# Altium footprint library 3M THD.PcbLib: 163 footprints (part 2 of 14) (continued)
## 3M_5150-B7A2PL [mm] "50 Contacts - Right Angle .100\" x .100\" Polarized Boardmount Socket, 5100 Series"
height 8.59
pads (52):
  round 1.6 hole 0.9: 1(30.48,-1.27) 2(30.48,1.27) 3(27.94,-1.27) 4(27.94,1.27) 5(25.4,-1.27) 6(25.4,1.27) 7(22.86,-1.27) 8(22.86,1.27) 9(20.32,-1.27) 10(20.32,1.27) 11(17.78,-1.27) 12(17.78,1.27) 13(15.24,-1.27) 14(15.24,1.27) 15(12.7,-1.27) 16(12.7,1.27) 17(10.16,-1.27) 18(10.16,1.27) 19(7.62,-1.27) 20(7.62,1.27) 21(5.08,-1.27) 22(5.08,1.27) 23(2.54,-1.27) 24(2.54,1.27) 25(0,-1.27) 26(0,1.27) 27(-2.54,-1.27) 28(-2.54,1.27) 29(-5.08,-1.27) 30(-5.08,1.27) 31(-7.62,-1.27) 32(-7.62,1.27) 33(-10.16,-1.27) 34(-10.16,1.27) 35(-12.7,-1.27) 36(-12.7,1.27) 37(-15.24,-1.27) 38(-15.24,1.27) 39(-17.78,-1.27) 40(-17.78,1.27) 41(-20.32,-1.27) 42(-20.32,1.27) 43(-22.86,-1.27) 44(-22.86,1.27) 45(-25.4,-1.27) 46(-25.4,1.27) 47(-27.94,-1.27) 48(-27.94,1.27) 49(-30.48,-1.27) 50(-30.48,1.27)
  round 5.5 hole 2.6: 51(-35.55,1.27) 52(35.55,1.27)
Top Overlay:
  circle w0.3: c30.48,-2.756 r0.15
  lines w0.2: -38.1,-0.579 -38.1,-1.888 -31.509,-1.888 ; -38.1,3.119 -38.1,4.97 -1.651,4.97 ; -38.1,4.462 -34.29,4.462 cw(c-34.29,3.192) -33.02,3.192 -33.02,3.147 ; -34.036,4.97 -34.036,12.59 34.036,12.59 34.036,4.97 ; -33.02,-1.888 -33.02,-0.607 ; -32.533,2.176 -31.267,2.176 ; -1.651,2.176 -1.651,12.59 ; 1.651,2.176 1.651,12.59 ; 1.651,4.97 38.1,4.97 38.1,3.119 ; 31.267,2.176 32.533,2.176 ; 31.509,-1.888 38.1,-1.888 38.1,-0.579 ; 33.02,-1.888 33.02,-0.607 ; 33.02,3.147 33.02,3.192 cw(c34.29,3.192) 34.29,4.462 38.1,4.462
  text "1" at 31.985,-1.312 h1.2
Mechanical 8:
  drawing of 213 lines, arcs and shapes, not listed
Mechanical 14:
  circle w0.1: c-35.55,1.27 r1.27
  circle w0.1: c35.55,1.27 r1.27
  circle w0.3: c30.48,-2.756 r0.15
  lines w0.1: -38.1,4.462 -34.29,4.462 cw(c-34.29,3.192) -33.02,3.192 -33.02,-1.888 ; -34.036,4.97 -34.036,12.59 34.036,12.59 34.036,4.97 ; -33.02,2.176 -1.651,2.176 -1.651,12.59 ; -1.651,4.97 -38.1,4.97 -38.1,-1.888 38.1,-1.888 38.1,4.97 1.651,4.97 ; 1.651,12.59 1.651,2.176 33.02,2.176 ; 33.02,-1.888 33.02,3.192 cw(c34.29,3.192) 34.29,4.462 38.1,4.462
  text "1" at 31.985,-1.312 h1.2
3D body "3M_5150-B7A2PL.stp": height 8.38, standoff -2.6, extent -38.1,-1.888 38.1,12.59

## 3M_6850-4500PL [mm] "50 Contacts - Straight .100\" x .100\" Centerbump Polarization Boardmount Socket, 6800 Series"
height 7.2
pads (50):
  round 1.6 hole 0.9: 1(30.48,1.27) 2(30.48,-1.27) 3(27.94,1.27) 4(27.94,-1.27) 5(25.4,1.27) 6(25.4,-1.27) 7(22.86,1.27) 8(22.86,-1.27) 9(20.32,1.27) 10(20.32,-1.27) 11(17.78,1.27) 12(17.78,-1.27) 13(15.24,1.27) 14(15.24,-1.27) 15(12.7,1.27) 16(12.7,-1.27) 17(10.16,1.27) 18(10.16,-1.27) 19(7.62,1.27) 20(7.62,-1.27) 21(5.08,1.27) 22(5.08,-1.27) 23(2.54,1.27) 24(2.54,-1.27) 25(0,1.27) 26(0,-1.27) 27(-2.54,1.27) 28(-2.54,-1.27) 29(-5.08,1.27) 30(-5.08,-1.27) 31(-7.62,1.27) 32(-7.62,-1.27) 33(-10.16,1.27) 34(-10.16,-1.27) 35(-12.7,1.27) 36(-12.7,-1.27) 37(-15.24,1.27) 38(-15.24,-1.27) 39(-17.78,1.27) 40(-17.78,-1.27) 41(-20.32,1.27) 42(-20.32,-1.27) 43(-22.86,1.27) 44(-22.86,-1.27) 45(-25.4,1.27) 46(-25.4,-1.27) 47(-27.94,1.27) 48(-27.94,-1.27) 49(-30.48,1.27) 50(-30.48,-1.27)
Top Overlay:
  circle w0.3: c30.48,-3.556 r0.15
  lines w0.2: -1.7,-3.05 -1.7,-4.05 1.7,-4.05 1.7,-3.05 ; -34.08,-2.3 ccw(c-33.33,-2.3) -33.33,-3.05 33.33,-3.05 ccw(c33.33,-2.3) 34.08,-2.3 34.08,-1.6 33.08,-1.6 33.08,1.6 34.08,1.6 34.08,2.3 ccw(c33.33,2.3) 33.33,3.05 -33.33,3.05 ccw(c-33.33,2.3) -34.08,2.3 -34.08,1.6 -33.08,1.6 -33.08,-1.6 -34.08,-1.6 -34.08,-2.3
Mechanical 8:
  drawing of 204 lines, arcs and shapes, not listed
Mechanical 14:
  drawing of 622 lines, arcs and shapes, not listed
3D body "3M_6850-4500PL.stp": height 7.2, standoff -2.8, extent -34.08,-4.05 34.08,3.05

## 3M_8510-4500PL [mm] "10 Contacts - Straight .100\" x .100\" Polarized Boardmount Socket, 8500 Series"
height 10.8
pads (10):
  round 1.7 hole 1: 1(5.08,-1.27) 2(5.08,1.27) 3(2.54,-1.27) 4(2.54,1.27) 5(0,-1.27) 6(0,1.27) 7(-2.54,-1.27) 8(-2.54,1.27) 9(-5.08,-1.27) 10(-5.08,1.27)
Top Overlay:
  circle w0.3: c5.08,-3.556 r0.15
  lines w0.2: -8.61,-1.625 ccw(c-7.21,-1.625) -7.21,-3.025 -1.7,-3.025 -1.7,-4.025 1.7,-4.025 1.7,-3.025 7.21,-3.025 ccw(c7.21,-1.625) 8.61,-1.625 8.61,-1.2 7.61,-1.2 7.61,1.2 8.61,1.2 8.61,1.625 ccw(c7.21,1.625) 7.21,3.025 -7.21,3.025 ccw(c-7.21,1.625) -8.61,1.625 -8.61,1.2 -7.61,1.2 -7.61,-1.2 -8.61,-1.2 -8.61,-1.625
Mechanical 8:
  lines w0.1: -5.58,-1.27 -5.08,-1.27 ; -5.58,1.27 -5.08,1.27 ; -5.08,-1.77 -5.08,-1.27 ; -5.08,-0.77 -5.08,-1.27 ; -5.08,0.77 -5.08,1.27 ; -5.08,1.77 -5.08,1.27 ; -4.58,-1.27 -5.08,-1.27 ; -4.58,1.27 -5.08,1.27 ; -3.04,-1.27 -2.54,-1.27 ; -3.04,1.27 -2.54,1.27 ; -2.54,-1.77 -2.54,-1.27 ; -2.54,-0.77 -2.54,-1.27 ; -2.54,0.77 -2.54,1.27 ; -2.54,1.77 -2.54,1.27 ; -2.04,-1.27 -2.54,-1.27 ; -2.04,1.27 -2.54,1.27 ; -0.5,-1.27 0,-1.27 ; -0.5,0 0,0 ; -0.5,1.27 0,1.27 ; 0,-1.77 0,-1.27 ; 0,-0.77 0,-1.27 ; 0,-0.5 0,0 ; 0,0.5 0,0 ; 0,0.77 0,1.27 ; 0,1.77 0,1.27 ; 0.5,-1.27 0,-1.27 ; 0.5,0 0,0 ; 0.5,1.27 0,1.27 ; 2.04,-1.27 2.54,-1.27 ; 2.04,1.27 2.54,1.27 ; 2.54,-1.77 2.54,-1.27 ; 2.54,-0.77 2.54,-1.27 ; 2.54,0.77 2.54,1.27 ; 2.54,1.77 2.54,1.27 ; 3.04,-1.27 2.54,-1.27 ; 3.04,1.27 2.54,1.27 ; 4.58,-1.27 5.08,-1.27 ; 4.58,1.27 5.08,1.27 ; 5.08,-1.77 5.08,-1.27 ; 5.08,-0.77 5.08,-1.27 ; 5.08,0.77 5.08,1.27 ; 5.08,1.77 5.08,1.27 ; 5.58,-1.27 5.08,-1.27 ; 5.58,1.27 5.08,1.27
Mechanical 14:
  circle w0.3: c5.08,-3.556 r0.15
  lines w0.1: 4.216,-3.05 5.08,-2.186 5.944,-3.05 ; -6.05,-2.27 -5.45,-1.67 ; -6.05,-2.27 -6.05,-0.27 ; -6.05,-2.27 -4.11,-2.27 ; -6.05,-0.27 -5.45,-0.87 ; -6.05,-0.27 -4.11,-0.27 ; -6.05,0.27 -5.45,0.87 ; -6.05,0.27 -4.11,0.27 ; -6.05,0.27 -6.05,2.27 ; -6.05,2.27 -5.45,1.67 ; -6.05,2.27 -4.11,2.27 ; -5.45,-1.67 -5.45,-0.87 ; -5.45,-1.67 -4.71,-1.67 ; -5.45,-0.87 -4.71,-0.87 ; -5.45,0.87 -5.45,1.67 ; -5.45,0.87 -4.71,0.87 ; -5.45,1.67 -4.71,1.67 ; -4.71,-1.67 -4.11,-2.27 ; -4.71,-1.67 -4.71,-0.87 ; -4.71,-0.87 -4.11,-0.27 ; -4.71,0.87 -4.11,0.27 ; -4.71,0.87 -4.71,1.67 ; -4.71,1.67 -4.11,2.27 ; -4.11,-2.27 -4.11,-0.27 ; -4.11,0.27 -4.11,2.27 ; -3.51,-2.27 -2.91,-1.67 ; -3.51,-2.27 -3.51,-0.27 ; -3.51,-2.27 -1.57,-2.27 ; -3.51,-0.27 -2.91,-0.87 ; -3.51,-0.27 -1.57,-0.27 ; -3.51,0.27 -2.91,0.87 ; -3.51,0.27 -1.57,0.27 ; -3.51,0.27 -3.51,2.27 ; -3.51,2.27 -2.91,1.67 ; -3.51,2.27 -1.57,2.27 ; -2.91,-1.67 -2.91,-0.87 ; -2.91,-1.67 -2.17,-1.67 ; -2.91,-0.87 -2.17,-0.87 ; -2.91,0.87 -2.91,1.67 ; -2.91,0.87 -2.17,0.87 ; -2.91,1.67 -2.17,1.67 ; -2.17,-1.67 -1.57,-2.27 ; -2.17,-1.67 -2.17,-0.87 ; -2.17,-0.87 -1.57,-0.27 ; -2.17,0.87 -1.57,0.27 ; -2.17,0.87 -2.17,1.67 ; -2.17,1.67 -1.57,2.27 ; -1.57,-2.27 -1.57,-0.27 ; -1.57,0.27 -1.57,2.27 ; -0.97,-2.27 -0.37,-1.67 ; -0.97,-2.27 -0.97,-0.27 ; -0.97,-2.27 0.97,-2.27 ; -0.97,-0.27 -0.37,-0.87 ; -0.97,-0.27 0.97,-0.27 ; -0.97,0.27 -0.37,0.87 ; -0.97,0.27 0.97,0.27 ; -0.97,0.27 -0.97,2.27 ; -0.97,2.27 -0.37,1.67 ; -0.97,2.27 0.97,2.27 ; -0.37,-1.67 -0.37,-0.87 ; -0.37,-1.67 0.37,-1.67 ; -0.37,-0.87 0.37,-0.87 ; -0.37,0.87 -0.37,1.67 ; -0.37,0.87 0.37,0.87 ; -0.37,1.67 0.37,1.67 ; 0.37,-1.67 0.97,-2.27 ; 0.37,-1.67 0.37,-0.87 ; 0.37,-0.87 0.97,-0.27 ; 0.37,0.87 0.97,0.27 ; 0.37,0.87 0.37,1.67 ; 0.37,1.67 0.97,2.27 ; 0.97,-2.27 0.97,-0.27 ; 0.97,0.27 0.97,2.27 ; 1.57,-2.27 2.17,-1.67 ; 1.57,-2.27 1.57,-0.27 ; 1.57,-2.27 3.51,-2.27 ; 1.57,-0.27 2.17,-0.87 ; 1.57,-0.27 3.51,-0.27 ; 1.57,0.27 2.17,0.87 ; 1.57,0.27 3.51,0.27 ; 1.57,0.27 1.57,2.27 ; 1.57,2.27 2.17,1.67 ; 1.57,2.27 3.51,2.27 ; 2.17,-1.67 2.17,-0.87 ; 2.17,-1.67 2.91,-1.67 ; 2.17,-0.87 2.91,-0.87 ; 2.17,0.87 2.17,1.67 ; 2.17,0.87 2.91,0.87 ; 2.17,1.67 2.91,1.67 ; 2.91,-1.67 3.51,-2.27 ; 2.91,-1.67 2.91,-0.87 ; 2.91,-0.87 3.51,-0.27 ; 2.91,0.87 3.51,0.27 ; 2.91,0.87 2.91,1.67 ; 2.91,1.67 3.51,2.27 ; 3.51,-2.27 3.51,-0.27 ; 3.51,0.27 3.51,2.27 ; 4.11,-2.27 4.71,-1.67 ; 4.11,-2.27 4.11,-0.27 ; 4.11,-2.27 6.05,-2.27 ; 4.11,-0.27 4.71,-0.87 ; 4.11,-0.27 6.05,-0.27 ; 4.11,0.27 4.71,0.87 ; 4.11,0.27 6.05,0.27 ; 4.11,0.27 4.11,2.27 ; 4.11,2.27 4.71,1.67 ; 4.11,2.27 6.05,2.27 ; 4.71,-1.67 4.71,-0.87 ; 4.71,-1.67 5.45,-1.67 ; 4.71,-0.87 5.45,-0.87 ; 4.71,0.87 4.71,1.67 ; 4.71,0.87 5.45,0.87 ; 4.71,1.67 5.45,1.67 ; 5.45,-1.67 6.05,-2.27 ; 5.45,-1.67 5.45,-0.87 ; 5.45,-0.87 6.05,-0.27 ; 5.45,0.87 6.05,0.27 ; 5.45,0.87 5.45,1.67 ; 5.45,1.67 6.05,2.27 ; 6.05,-2.27 6.05,-0.27 ; 6.05,0.27 6.05,2.27 ; -8.61,-1.625 ccw(c-7.21,-1.625) -7.21,-3.025 -1.7,-3.025 -1.7,-4.025 1.7,-4.025 1.7,-3.025 7.21,-3.025 ccw(c7.21,-1.625) 8.61,-1.625 8.61,-1.2 7.61,-1.2 7.61,1.2 8.61,1.2 8.61,1.625 ccw(c7.21,1.625) 7.21,3.025 -7.21,3.025 ccw(c-7.21,1.625) -8.61,1.625 -8.61,1.2 -7.61,1.2 -7.61,-1.2 -8.61,-1.2 -8.61,-1.625
3D body "3M_8510-4500PL.stp": height 10.8, standoff -2.8, extent -8.61,-4.025 8.61,3.025

## 3M_8516-4500PL [mm] "16 Contacts - Straight .100\" x .100\" Polarized Boardmount Socket, 8500 Series"
height 10.8
pads (16):
  round 1.7 hole 1: 1(8.89,-1.27) 2(8.89,1.27) 3(6.35,-1.27) 4(6.35,1.27) 5(3.81,-1.27) 6(3.81,1.27) 7(1.27,-1.27) 8(1.27,1.27) 9(-1.27,-1.27) 10(-1.27,1.27) 11(-3.81,-1.27) 12(-3.81,1.27) 13(-6.35,-1.27) 14(-6.35,1.27) 15(-8.89,-1.27) 16(-8.89,1.27)
Top Overlay:
  circle w0.3: c11.43,-3.556 r0.15
  lines w0.2: 12.406,1.729 12.41,1.2 11.41,1.2 11.41,-1.2 12.41,-1.2 12.41,-1.625 cw(c11.01,-1.625) 11.01,-3.025 5.83,-3.025 5.449,-2.365 4.691,-2.365 4.31,-3.025 1.7,-3.025 1.7,-4.025 -1.7,-4.025 -1.7,-3.025 -6.85,-3.025 -7.231,-2.365 -7.989,-2.365 -8.37,-3.025 -11.01,-3.025 cw(c-11.01,-1.625) -12.41,-1.625 -12.41,-1.2 -11.41,-1.2 -11.41,1.2 -12.41,1.2 -12.41,1.625 cw(c-11.01,1.625) -11.01,3.025 11.01,3.025 cw(c11.01,1.625) 12.41,1.625
Mechanical 8:
  lines w0.05: -9.39,-1.27 -8.89,-1.27 ; -9.39,1.27 -8.89,1.27 ; -8.89,-1.77 -8.89,-1.27 ; -8.89,-0.77 -8.89,-1.27 ; -8.89,0.77 -8.89,1.27 ; -8.89,1.77 -8.89,1.27 ; -8.39,-1.27 -8.89,-1.27 ; -8.39,1.27 -8.89,1.27 ; -6.85,-1.27 -6.35,-1.27 ; -6.85,1.27 -6.35,1.27 ; -6.35,-1.77 -6.35,-1.27 ; -6.35,-0.77 -6.35,-1.27 ; -6.35,0.77 -6.35,1.27 ; -6.35,1.77 -6.35,1.27 ; -5.85,-1.27 -6.35,-1.27 ; -5.85,1.27 -6.35,1.27 ; -4.31,-1.27 -3.81,-1.27 ; -4.31,1.27 -3.81,1.27 ; -3.81,-1.77 -3.81,-1.27 ; -3.81,-0.77 -3.81,-1.27 ; -3.81,0.77 -3.81,1.27 ; -3.81,1.77 -3.81,1.27 ; -3.31,-1.27 -3.81,-1.27 ; -3.31,1.27 -3.81,1.27 ; -1.77,-1.27 -1.27,-1.27 ; -1.77,1.27 -1.27,1.27 ; -1.27,-1.77 -1.27,-1.27 ; -1.27,-0.77 -1.27,-1.27 ; -1.27,0.77 -1.27,1.27 ; -1.27,1.77 -1.27,1.27 ; -0.77,-1.27 -1.27,-1.27 ; -0.77,1.27 -1.27,1.27 ; -0.5,0 0,0 ; 0,-0.5 0,0 ; 0,0.5 0,0 ; 0.5,0 0,0 ; 0.77,-1.27 1.27,-1.27 ; 0.77,1.27 1.27,1.27 ; 1.27,-1.77 1.27,-1.27 ; 1.27,-0.77 1.27,-1.27 ; 1.27,0.77 1.27,1.27 ; 1.27,1.77 1.27,1.27 ; 1.77,-1.27 1.27,-1.27 ; 1.77,1.27 1.27,1.27 ; 3.31,-1.27 3.81,-1.27 ; 3.31,1.27 3.81,1.27 ; 3.81,-1.77 3.81,-1.27 ; 3.81,-0.77 3.81,-1.27 ; 3.81,0.77 3.81,1.27 ; 3.81,1.77 3.81,1.27 ; 4.31,-1.27 3.81,-1.27 ; 4.31,1.27 3.81,1.27 ; 5.85,-1.27 6.35,-1.27 ; 5.85,1.27 6.35,1.27 ; 6.35,-1.77 6.35,-1.27 ; 6.35,-0.77 6.35,-1.27 ; 6.35,0.77 6.35,1.27 ; 6.35,1.77 6.35,1.27 ; 6.85,-1.27 6.35,-1.27 ; 6.85,1.27 6.35,1.27 ; 8.39,-1.27 8.89,-1.27 ; 8.39,1.27 8.89,1.27 ; 8.89,-1.77 8.89,-1.27 ; 8.89,-0.77 8.89,-1.27 ; 8.89,0.77 8.89,1.27 ; 8.89,1.77 8.89,1.27 ; 9.39,-1.27 8.89,-1.27 ; 9.39,1.27 8.89,1.27
Mechanical 14:
  drawing of 228 lines, arcs and shapes, not listed
3D body "3M_8516-4500PL.stp": height 10.8, standoff -2.8, extent -12.41,-4.025 12.41,3.025

## 3M_8520-4500PL [mm] "20 Contacts - Straight .100\" x .100\" Polarized Boardmount Socket, 8500 Series"
height 10.8
pads (20):
  round 1.7 hole 1: 1(11.43,-1.27) 2(11.43,1.27) 3(8.89,-1.27) 4(8.89,1.27) 5(6.35,-1.27) 6(6.35,1.27) 7(3.81,-1.27) 8(3.81,1.27) 9(1.27,-1.27) 10(1.27,1.27) 11(-1.27,-1.27) 12(-1.27,1.27) 13(-3.81,-1.27) 14(-3.81,1.27) 15(-6.35,-1.27) 16(-6.35,1.27) 17(-8.89,-1.27) 18(-8.89,1.27) 19(-11.43,-1.27) 20(-11.43,1.27)
Top Overlay:
  circle w0.3: c11.43,-3.556 r0.15
  lines w0.2: 14.946,1.729 14.95,1.2 13.95,1.2 13.95,-1.2 14.95,-1.2 14.95,-1.625 cw(c13.55,-1.625) 13.55,-3.025 8.37,-3.025 7.989,-2.365 7.231,-2.365 6.85,-3.025 1.7,-3.025 1.7,-4.025 -1.7,-4.025 -1.7,-3.025 -9.39,-3.025 -9.771,-2.365 -10.529,-2.365 -10.91,-3.025 -13.55,-3.025 cw(c-13.55,-1.625) -14.95,-1.625 -14.95,-1.2 -13.95,-1.2 -13.95,1.2 -14.95,1.2 -14.95,1.625 cw(c-13.55,1.625) -13.55,3.025 13.55,3.025 cw(c13.55,1.625) 14.95,1.625
Mechanical 8:
  lines w0.1: -11.93,-1.27 -11.43,-1.27 ; -11.93,1.27 -11.43,1.27 ; -11.43,-1.77 -11.43,-1.27 ; -11.43,-0.77 -11.43,-1.27 ; -11.43,0.77 -11.43,1.27 ; -11.43,1.77 -11.43,1.27 ; -10.93,-1.27 -11.43,-1.27 ; -10.93,1.27 -11.43,1.27 ; -9.39,-1.27 -8.89,-1.27 ; -9.39,1.27 -8.89,1.27 ; -8.89,-1.77 -8.89,-1.27 ; -8.89,-0.77 -8.89,-1.27 ; -8.89,0.77 -8.89,1.27 ; -8.89,1.77 -8.89,1.27 ; -8.39,-1.27 -8.89,-1.27 ; -8.39,1.27 -8.89,1.27 ; -6.85,-1.27 -6.35,-1.27 ; -6.85,1.27 -6.35,1.27 ; -6.35,-1.77 -6.35,-1.27 ; -6.35,-0.77 -6.35,-1.27 ; -6.35,0.77 -6.35,1.27 ; -6.35,1.77 -6.35,1.27 ; -5.85,-1.27 -6.35,-1.27 ; -5.85,1.27 -6.35,1.27 ; -4.31,-1.27 -3.81,-1.27 ; -4.31,1.27 -3.81,1.27 ; -3.81,-1.77 -3.81,-1.27 ; -3.81,-0.77 -3.81,-1.27 ; -3.81,0.77 -3.81,1.27 ; -3.81,1.77 -3.81,1.27 ; -3.31,-1.27 -3.81,-1.27 ; -3.31,1.27 -3.81,1.27 ; -1.77,-1.27 -1.27,-1.27 ; -1.77,1.27 -1.27,1.27 ; -1.27,-1.77 -1.27,-1.27 ; -1.27,-0.77 -1.27,-1.27 ; -1.27,0.77 -1.27,1.27 ; -1.27,1.77 -1.27,1.27 ; -0.77,-1.27 -1.27,-1.27 ; -0.77,1.27 -1.27,1.27 ; -0.5,0 0,0 ; 0,-0.5 0,0 ; 0,0.5 0,0 ; 0.5,0 0,0 ; 0.77,-1.27 1.27,-1.27 ; 0.77,1.27 1.27,1.27 ; 1.27,-1.77 1.27,-1.27 ; 1.27,-0.77 1.27,-1.27 ; 1.27,0.77 1.27,1.27 ; 1.27,1.77 1.27,1.27 ; 1.77,-1.27 1.27,-1.27 ; 1.77,1.27 1.27,1.27 ; 3.31,-1.27 3.81,-1.27 ; 3.31,1.27 3.81,1.27 ; 3.81,-1.77 3.81,-1.27 ; 3.81,-0.77 3.81,-1.27 ; 3.81,0.77 3.81,1.27 ; 3.81,1.77 3.81,1.27 ; 4.31,-1.27 3.81,-1.27 ; 4.31,1.27 3.81,1.27 ; 5.85,-1.27 6.35,-1.27 ; 5.85,1.27 6.35,1.27 ; 6.35,-1.77 6.35,-1.27 ; 6.35,-0.77 6.35,-1.27 ; 6.35,0.77 6.35,1.27 ; 6.35,1.77 6.35,1.27 ; 6.85,-1.27 6.35,-1.27 ; 6.85,1.27 6.35,1.27 ; 8.39,-1.27 8.89,-1.27 ; 8.39,1.27 8.89,1.27 ; 8.89,-1.77 8.89,-1.27 ; 8.89,-0.77 8.89,-1.27 ; 8.89,0.77 8.89,1.27 ; 8.89,1.77 8.89,1.27 ; 9.39,-1.27 8.89,-1.27 ; 9.39,1.27 8.89,1.27 ; 10.93,-1.27 11.43,-1.27 ; 10.93,1.27 11.43,1.27 ; 11.43,-1.77 11.43,-1.27 ; 11.43,-0.77 11.43,-1.27 ; 11.43,0.77 11.43,1.27 ; 11.43,1.77 11.43,1.27 ; 11.93,-1.27 11.43,-1.27 ; 11.93,1.27 11.43,1.27
Mechanical 14:
  drawing of 280 lines, arcs and shapes, not listed
3D body "3M_8520-4500PL.stp": height 10.8, standoff -2.8, extent -14.95,-4.025 14.95,3.025

## 3M_9120-4500PL [mm] "20 Contacts - Straight .100\" x .100\" Polarized Boardmount Socket, 9100 Series"
height 9
pads (20):
  round 1.6 hole 0.9: 1(11.43,-1.27) 2(11.43,1.27) 3(8.89,-1.27) 4(8.89,1.27) 5(6.35,-1.27) 6(6.35,1.27) 7(3.81,-1.27) 8(3.81,1.27) 9(1.27,-1.27) 10(1.27,1.27) 11(-1.27,-1.27) 12(-1.27,1.27) 13(-3.81,-1.27) 14(-3.81,1.27) 15(-6.35,-1.27) 16(-6.35,1.27) 17(-8.89,-1.27) 18(-8.89,1.27) 19(-11.43,-1.27) 20(-11.43,1.27)
Top Overlay:
  circle w0.3: c11.43,-3.556 r0.15
  lines w0.2: -1.7,-3.05 -1.7,-4.05 1.7,-4.05 1.7,-3.05 ; -14.95,-2.05 ccw(c-13.95,-2.05) -13.95,-3.05 13.95,-3.05 ccw(c13.95,-2.05) 14.95,-2.05 14.95,-1.27 13.95,-1.27 13.95,1.27 14.95,1.27 14.95,2.05 ccw(c13.95,2.05) 13.95,3.05 -13.95,3.05 ccw(c-13.95,2.05) -14.95,2.05 -14.95,1.27 -13.95,1.27 -13.95,-1.27 -14.95,-1.27 -14.95,-2.05
Mechanical 8:
  lines w0.1: -12.43,-1.27 -11.43,-1.27 ; -12.43,1.27 -11.43,1.27 ; -11.43,-2.27 -11.43,-1.27 ; -11.43,-0.27 -11.43,-1.27 ; -11.43,0.27 -11.43,1.27 ; -11.43,2.27 -11.43,1.27 ; -10.43,-1.27 -11.43,-1.27 ; -10.43,1.27 -11.43,1.27 ; -9.89,-1.27 -8.89,-1.27 ; -9.89,1.27 -8.89,1.27 ; -8.89,-2.27 -8.89,-1.27 ; -8.89,-0.27 -8.89,-1.27 ; -8.89,0.27 -8.89,1.27 ; -8.89,2.27 -8.89,1.27 ; -7.89,-1.27 -8.89,-1.27 ; -7.89,1.27 -8.89,1.27 ; -7.35,-1.27 -6.35,-1.27 ; -7.35,1.27 -6.35,1.27 ; -6.35,-2.27 -6.35,-1.27 ; -6.35,-0.27 -6.35,-1.27 ; -6.35,0.27 -6.35,1.27 ; -6.35,2.27 -6.35,1.27 ; -5.35,-1.27 -6.35,-1.27 ; -5.35,1.27 -6.35,1.27 ; -4.81,-1.27 -3.81,-1.27 ; -4.81,1.27 -3.81,1.27 ; -3.81,-2.27 -3.81,-1.27 ; -3.81,-0.27 -3.81,-1.27 ; -3.81,0.27 -3.81,1.27 ; -3.81,2.27 -3.81,1.27 ; -2.81,-1.27 -3.81,-1.27 ; -2.81,1.27 -3.81,1.27 ; -2.27,-1.27 -1.27,-1.27 ; -2.27,1.27 -1.27,1.27 ; -1.27,-2.27 -1.27,-1.27 ; -1.27,-0.27 -1.27,-1.27 ; -1.27,0.27 -1.27,1.27 ; -1.27,2.27 -1.27,1.27 ; -1,0 0,0 ; -0.27,-1.27 -1.27,-1.27 ; -0.27,1.27 -1.27,1.27 ; 0,-1 0,0 ; 0,1 0,0 ; 0.27,-1.27 1.27,-1.27 ; 0.27,1.27 1.27,1.27 ; 1,0 0,0 ; 1.27,-2.27 1.27,-1.27 ; 1.27,-0.27 1.27,-1.27 ; 1.27,0.27 1.27,1.27 ; 1.27,2.27 1.27,1.27 ; 2.27,-1.27 1.27,-1.27 ; 2.27,1.27 1.27,1.27 ; 2.81,-1.27 3.81,-1.27 ; 2.81,1.27 3.81,1.27 ; 3.81,-2.27 3.81,-1.27 ; 3.81,-0.27 3.81,-1.27 ; 3.81,0.27 3.81,1.27 ; 3.81,2.27 3.81,1.27 ; 4.81,-1.27 3.81,-1.27 ; 4.81,1.27 3.81,1.27 ; 5.35,-1.27 6.35,-1.27 ; 5.35,1.27 6.35,1.27 ; 6.35,-2.27 6.35,-1.27 ; 6.35,-0.27 6.35,-1.27 ; 6.35,0.27 6.35,1.27 ; 6.35,2.27 6.35,1.27 ; 7.35,-1.27 6.35,-1.27 ; 7.35,1.27 6.35,1.27 ; 7.89,-1.27 8.89,-1.27 ; 7.89,1.27 8.89,1.27 ; 8.89,-2.27 8.89,-1.27 ; 8.89,-0.27 8.89,-1.27 ; 8.89,0.27 8.89,1.27 ; 8.89,2.27 8.89,1.27 ; 9.89,-1.27 8.89,-1.27 ; 9.89,1.27 8.89,1.27 ; 10.43,-1.27 11.43,-1.27 ; 10.43,1.27 11.43,1.27 ; 11.43,-2.27 11.43,-1.27 ; 11.43,-0.27 11.43,-1.27 ; 11.43,0.27 11.43,1.27 ; 11.43,2.27 11.43,1.27 ; 12.43,-1.27 11.43,-1.27 ; 12.43,1.27 11.43,1.27
Mechanical 14:
  circle w0.3: c11.43,-3.556 r0.15
  lines w0.1: 10.566,-3.05 11.43,-2.186 12.294,-3.05 ; -14.95,-2.05 ccw(c-13.95,-2.05) -13.95,-3.05 13.95,-3.05 ccw(c13.95,-2.05) 14.95,-2.05 14.95,-1.27 13.95,-1.27 13.95,1.27 14.95,1.27 14.95,2.05 ccw(c13.95,2.05) 13.95,3.05 -13.95,3.05 ccw(c-13.95,2.05) -14.95,2.05 -14.95,1.27 -13.95,1.27 -13.95,-1.27 -14.95,-1.27 ; -14.95,-2.05 -14.95,-1.27 ; -14.95,-2.05 -14.95,-1.27 ; -1.7,-4.05 1.7,-4.05 1.7,-3.05 -1.7,-3.05 -1.7,-4.05
3D body "3M_9120-4500PL.stp": height 9, standoff -2.8, extent -14.95,-4.05 14.95,3.05

## 3M_9126-4500PL [mm] "26 Contacts - Straight .100\" x .100\" Polarized Boardmount Socket, 9100 Series"
height 9
pads (26):
  round 1.6 hole 0.9: 1(15.24,-1.27) 2(15.24,1.27) 3(12.7,-1.27) 4(12.7,1.27) 5(10.16,-1.27) 6(10.16,1.27) 7(7.62,-1.27) 8(7.62,1.27) 9(5.08,-1.27) 10(5.08,1.27) 11(2.54,-1.27) 12(2.54,1.27) 13(0,-1.27) 14(0,1.27) 15(-2.54,-1.27) 16(-2.54,1.27) 17(-5.08,-1.27) 18(-5.08,1.27) 19(-7.62,-1.27) 20(-7.62,1.27) 21(-10.16,-1.27) 22(-10.16,1.27) 23(-12.7,-1.27) 24(-12.7,1.27) 25(-15.24,-1.27) 26(-15.24,1.27)
Top Overlay:
  circle w0.3: c15.24,-3.556 r0.15
  lines w0.2: -1.7,-3.05 -1.7,-4.05 1.7,-4.05 1.7,-3.05 ; -18.76,-2.05 ccw(c-17.76,-2.05) -17.76,-3.05 17.74,-3.05 ccw(c17.74,-2.05) 18.74,-2.05 18.74,-1.27 17.74,-1.27 17.74,1.27 18.74,1.27 18.74,2.05 ccw(c17.74,2.05) 17.74,3.05 -17.76,3.05 ccw(c-17.76,2.05) -18.76,2.05 -18.76,1.27 -17.76,1.27 -17.76,-1.27 -18.76,-1.27 ; -18.76,-2.05 -18.76,-1.27 ; -18.76,-2.05 -18.76,-1.27
Mechanical 8:
  lines w0.1: -16.24,-1.27 -15.24,-1.27 ; -16.24,1.27 -15.24,1.27 ; -15.24,-2.27 -15.24,-1.27 ; -15.24,-0.27 -15.24,-1.27 ; -15.24,0.27 -15.24,1.27 ; -15.24,2.27 -15.24,1.27 ; -14.24,-1.27 -15.24,-1.27 ; -14.24,1.27 -15.24,1.27 ; -13.7,-1.27 -12.7,-1.27 ; -13.7,1.27 -12.7,1.27 ; -12.7,-2.27 -12.7,-1.27 ; -12.7,-0.27 -12.7,-1.27 ; -12.7,0.27 -12.7,1.27 ; -12.7,2.27 -12.7,1.27 ; -11.7,-1.27 -12.7,-1.27 ; -11.7,1.27 -12.7,1.27 ; -11.16,-1.27 -10.16,-1.27 ; -11.16,1.27 -10.16,1.27 ; -10.16,-2.27 -10.16,-1.27 ; -10.16,-0.27 -10.16,-1.27 ; -10.16,0.27 -10.16,1.27 ; -10.16,2.27 -10.16,1.27 ; -9.16,-1.27 -10.16,-1.27 ; -9.16,1.27 -10.16,1.27 ; -8.62,-1.27 -7.62,-1.27 ; -8.62,1.27 -7.62,1.27 ; -7.62,-2.27 -7.62,-1.27 ; -7.62,-0.27 -7.62,-1.27 ; -7.62,0.27 -7.62,1.27 ; -7.62,2.27 -7.62,1.27 ; -6.62,-1.27 -7.62,-1.27 ; -6.62,1.27 -7.62,1.27 ; -6.08,-1.27 -5.08,-1.27 ; -6.08,1.27 -5.08,1.27 ; -5.08,-2.27 -5.08,-1.27 ; -5.08,-0.27 -5.08,-1.27 ; -5.08,0.27 -5.08,1.27 ; -5.08,2.27 -5.08,1.27 ; -4.08,-1.27 -5.08,-1.27 ; -4.08,1.27 -5.08,1.27 ; -3.54,-1.27 -2.54,-1.27 ; -3.54,1.27 -2.54,1.27 ; -2.54,-2.27 -2.54,-1.27 ; -2.54,-0.27 -2.54,-1.27 ; -2.54,0.27 -2.54,1.27 ; -2.54,2.27 -2.54,1.27 ; -1.54,-1.27 -2.54,-1.27 ; -1.54,1.27 -2.54,1.27 ; -1,-1.27 0,-1.27 ; -1,0 0,0 ; -1,1.27 0,1.27 ; 0,-2.27 0,-1.27 ; 0,-1 0,0 ; 0,-0.27 0,-1.27 ; 0,0.27 0,1.27 ; 0,1 0,0 ; 0,2.27 0,1.27 ; 1,-1.27 0,-1.27 ; 1,0 0,0 ; 1,1.27 0,1.27 ; 1.54,-1.27 2.54,-1.27 ; 1.54,1.27 2.54,1.27 ; 2.54,-2.27 2.54,-1.27 ; 2.54,-0.27 2.54,-1.27 ; 2.54,0.27 2.54,1.27 ; 2.54,2.27 2.54,1.27 ; 3.54,-1.27 2.54,-1.27 ; 3.54,1.27 2.54,1.27 ; 4.08,-1.27 5.08,-1.27 ; 4.08,1.27 5.08,1.27 ; 5.08,-2.27 5.08,-1.27 ; 5.08,-0.27 5.08,-1.27 ; 5.08,0.27 5.08,1.27 ; 5.08,2.27 5.08,1.27 ; 6.08,-1.27 5.08,-1.27 ; 6.08,1.27 5.08,1.27 ; 6.62,-1.27 7.62,-1.27 ; 6.62,1.27 7.62,1.27 ; 7.62,-2.27 7.62,-1.27 ; 7.62,-0.27 7.62,-1.27 ; 7.62,0.27 7.62,1.27 ; 7.62,2.27 7.62,1.27 ; 8.62,-1.27 7.62,-1.27 ; 8.62,1.27 7.62,1.27 ; 9.16,-1.27 10.16,-1.27 ; 9.16,1.27 10.16,1.27 ; 10.16,-2.27 10.16,-1.27 ; 10.16,-0.27 10.16,-1.27 ; 10.16,0.27 10.16,1.27 ; 10.16,2.27 10.16,1.27 ; 11.16,-1.27 10.16,-1.27 ; 11.16,1.27 10.16,1.27 ; 11.7,-1.27 12.7,-1.27 ; 11.7,1.27 12.7,1.27 ; 12.7,-2.27 12.7,-1.27 ; 12.7,-0.27 12.7,-1.27 ; 12.7,0.27 12.7,1.27 ; 12.7,2.27 12.7,1.27 ; 13.7,-1.27 12.7,-1.27 ; 13.7,1.27 12.7,1.27 ; 14.24,-1.27 15.24,-1.27 ; 14.24,1.27 15.24,1.27 ; 15.24,-2.27 15.24,-1.27 ; 15.24,-0.27 15.24,-1.27 ; 15.24,0.27 15.24,1.27 ; 15.24,2.27 15.24,1.27 ; 16.24,-1.27 15.24,-1.27 ; 16.24,1.27 15.24,1.27
Mechanical 14:
  circle w0.3: c15.24,-3.556 r0.15
  lines w0.1: -1.7,-3.05 -1.7,-4.05 1.7,-4.05 1.7,-3.05 ; 14.376,-3.05 15.24,-2.186 16.104,-3.05 ; -18.76,-2.05 ccw(c-17.76,-2.05) -17.76,-3.05 17.74,-3.05 ccw(c17.74,-2.05) 18.74,-2.05 18.74,-1.27 17.74,-1.27 17.74,1.27 18.74,1.27 18.74,2.05 ccw(c17.74,2.05) 17.74,3.05 -17.76,3.05 ccw(c-17.76,2.05) -18.76,2.05 -18.76,1.27 -17.76,1.27 -17.76,-1.27 -18.76,-1.27 ; -18.76,-2.05 -18.76,-1.27 ; -18.76,-2.05 -18.76,-1.27
3D body "3M_9126-4500PL.stp": height 9, standoff -2.8, extent -18.76,-4.05 18.74,3.05

## 3M_9134-4500PL [mm] "34 Contacts - Straight .100\" x .100\" Polarized Boardmount Socket, 9100 Series"
height 9
pads (34):
  round 1.6 hole 0.9: 1(20.32,-1.27) 2(20.32,1.27) 3(17.78,-1.27) 4(17.78,1.27) 5(15.24,-1.27) 6(15.24,1.27) 7(12.7,-1.27) 8(12.7,1.27) 9(10.16,-1.27) 10(10.16,1.27) 11(7.62,-1.27) 12(7.62,1.27) 13(5.08,-1.27) 14(5.08,1.27) 15(2.54,-1.27) 16(2.54,1.27) 17(0,-1.27) 18(0,1.27) 19(-2.54,-1.27) 20(-2.54,1.27) 21(-5.08,-1.27) 22(-5.08,1.27) 23(-7.62,-1.27) 24(-7.62,1.27) 25(-10.16,-1.27) 26(-10.16,1.27) 27(-12.7,-1.27) 28(-12.7,1.27) 29(-15.24,-1.27) 30(-15.24,1.27) 31(-17.78,-1.27) 32(-17.78,1.27) 33(-20.32,-1.27) 34(-20.32,1.27)
Top Overlay:
  circle w0.3: c20.32,-3.556 r0.15
  lines w0.2: -1.7,-3.05 -1.7,-4.05 1.7,-4.05 1.7,-3.05 ; -23.86,-2.05 ccw(c-22.86,-2.05) -22.86,-3.05 22.84,-3.05 ccw(c22.84,-2.05) 23.84,-2.05 23.84,-1.27 22.84,-1.27 22.84,1.27 23.84,1.27 23.84,2.05 ccw(c22.84,2.05) 22.84,3.05 -22.86,3.05 ccw(c-22.86,2.05) -23.86,2.05 -23.86,1.27 -22.86,1.27 -22.86,-1.27 -23.86,-1.27 ; -23.86,-2.05 -23.86,-1.27 ; -23.86,-2.05 -23.86,-1.27
Mechanical 8:
  lines w0.1: -21.32,-1.27 -20.32,-1.27 ; -21.32,1.27 -20.32,1.27 ; -20.32,-2.27 -20.32,-1.27 ; -20.32,-0.27 -20.32,-1.27 ; -20.32,0.27 -20.32,1.27 ; -20.32,2.27 -20.32,1.27 ; -19.32,-1.27 -20.32,-1.27 ; -19.32,1.27 -20.32,1.27 ; -18.78,-1.27 -17.78,-1.27 ; -18.78,1.27 -17.78,1.27 ; -17.78,-2.27 -17.78,-1.27 ; -17.78,-0.27 -17.78,-1.27 ; -17.78,0.27 -17.78,1.27 ; -17.78,2.27 -17.78,1.27 ; -16.78,-1.27 -17.78,-1.27 ; -16.78,1.27 -17.78,1.27 ; -16.24,-1.27 -15.24,-1.27 ; -16.24,1.27 -15.24,1.27 ; -15.24,-2.27 -15.24,-1.27 ; -15.24,-0.27 -15.24,-1.27 ; -15.24,0.27 -15.24,1.27 ; -15.24,2.27 -15.24,1.27 ; -14.24,-1.27 -15.24,-1.27 ; -14.24,1.27 -15.24,1.27 ; -13.7,-1.27 -12.7,-1.27 ; -13.7,1.27 -12.7,1.27 ; -12.7,-2.27 -12.7,-1.27 ; -12.7,-0.27 -12.7,-1.27 ; -12.7,0.27 -12.7,1.27 ; -12.7,2.27 -12.7,1.27 ; -11.7,-1.27 -12.7,-1.27 ; -11.7,1.27 -12.7,1.27 ; -11.16,-1.27 -10.16,-1.27 ; -11.16,1.27 -10.16,1.27 ; -10.16,-2.27 -10.16,-1.27 ; -10.16,-0.27 -10.16,-1.27 ; -10.16,0.27 -10.16,1.27 ; -10.16,2.27 -10.16,1.27 ; -9.16,-1.27 -10.16,-1.27 ; -9.16,1.27 -10.16,1.27 ; -8.62,-1.27 -7.62,-1.27 ; -8.62,1.27 -7.62,1.27 ; -7.62,-2.27 -7.62,-1.27 ; -7.62,-0.27 -7.62,-1.27 ; -7.62,0.27 -7.62,1.27 ; -7.62,2.27 -7.62,1.27 ; -6.62,-1.27 -7.62,-1.27 ; -6.62,1.27 -7.62,1.27 ; -6.08,-1.27 -5.08,-1.27 ; -6.08,1.27 -5.08,1.27 ; -5.08,-2.27 -5.08,-1.27 ; -5.08,-0.27 -5.08,-1.27 ; -5.08,0.27 -5.08,1.27 ; -5.08,2.27 -5.08,1.27 ; -4.08,-1.27 -5.08,-1.27 ; -4.08,1.27 -5.08,1.27 ; -3.54,-1.27 -2.54,-1.27 ; -3.54,1.27 -2.54,1.27 ; -2.54,-2.27 -2.54,-1.27 ; -2.54,-0.27 -2.54,-1.27 ; -2.54,0.27 -2.54,1.27 ; -2.54,2.27 -2.54,1.27 ; -1.54,-1.27 -2.54,-1.27 ; -1.54,1.27 -2.54,1.27 ; -1,-1.27 0,-1.27 ; -1,0 0,0 ; -1,1.27 0,1.27 ; 0,-2.27 0,-1.27 ; 0,-1 0,0 ; 0,-0.27 0,-1.27 ; 0,0.27 0,1.27 ; 0,1 0,0 ; 0,2.27 0,1.27 ; 1,-1.27 0,-1.27 ; 1,0 0,0 ; 1,1.27 0,1.27 ; 1.54,-1.27 2.54,-1.27 ; 1.54,1.27 2.54,1.27 ; 2.54,-2.27 2.54,-1.27 ; 2.54,-0.27 2.54,-1.27 ; 2.54,0.27 2.54,1.27 ; 2.54,2.27 2.54,1.27 ; 3.54,-1.27 2.54,-1.27 ; 3.54,1.27 2.54,1.27 ; 4.08,-1.27 5.08,-1.27 ; 4.08,1.27 5.08,1.27 ; 5.08,-2.27 5.08,-1.27 ; 5.08,-0.27 5.08,-1.27 ; 5.08,0.27 5.08,1.27 ; 5.08,2.27 5.08,1.27 ; 6.08,-1.27 5.08,-1.27 ; 6.08,1.27 5.08,1.27 ; 6.62,-1.27 7.62,-1.27 ; 6.62,1.27 7.62,1.27 ; 7.62,-2.27 7.62,-1.27 ; 7.62,-0.27 7.62,-1.27 ; 7.62,0.27 7.62,1.27 ; 7.62,2.27 7.62,1.27 ; 8.62,-1.27 7.62,-1.27 ; 8.62,1.27 7.62,1.27 ; 9.16,-1.27 10.16,-1.27 ; 9.16,1.27 10.16,1.27 ; 10.16,-2.27 10.16,-1.27 ; 10.16,-0.27 10.16,-1.27 ; 10.16,0.27 10.16,1.27 ; 10.16,2.27 10.16,1.27 ; 11.16,-1.27 10.16,-1.27 ; 11.16,1.27 10.16,1.27 ; 11.7,-1.27 12.7,-1.27 ; 11.7,1.27 12.7,1.27 ; 12.7,-2.27 12.7,-1.27 ; 12.7,-0.27 12.7,-1.27 ; 12.7,0.27 12.7,1.27 ; 12.7,2.27 12.7,1.27 ; 13.7,-1.27 12.7,-1.27 ; 13.7,1.27 12.7,1.27 ; 14.24,-1.27 15.24,-1.27 ; 14.24,1.27 15.24,1.27 ; 15.24,-2.27 15.24,-1.27 ; 15.24,-0.27 15.24,-1.27 ; 15.24,0.27 15.24,1.27 ; 15.24,2.27 15.24,1.27 ; 16.24,-1.27 15.24,-1.27 ; 16.24,1.27 15.24,1.27 ; 16.78,-1.27 17.78,-1.27 ; 16.78,1.27 17.78,1.27 ; 17.78,-2.27 17.78,-1.27 ; 17.78,-0.27 17.78,-1.27 ; 17.78,0.27 17.78,1.27 ; 17.78,2.27 17.78,1.27 ; 18.78,-1.27 17.78,-1.27 ; 18.78,1.27 17.78,1.27 ; 19.32,-1.27 20.32,-1.27 ; 19.32,1.27 20.32,1.27 ; 20.32,-2.27 20.32,-1.27 ; 20.32,-0.27 20.32,-1.27 ; 20.32,0.27 20.32,1.27 ; 20.32,2.27 20.32,1.27 ; 21.32,-1.27 20.32,-1.27 ; 21.32,1.27 20.32,1.27
Mechanical 14:
  circle w0.3: c20.32,-3.556 r0.15
  lines w0.1: -1.7,-3.05 -1.7,-4.05 1.7,-4.05 1.7,-3.05 ; 19.456,-3.05 20.32,-2.186 21.184,-3.05 ; -23.86,-2.05 ccw(c-22.86,-2.05) -22.86,-3.05 22.84,-3.05 ccw(c22.84,-2.05) 23.84,-2.05 23.84,-1.27 22.84,-1.27 22.84,1.27 23.84,1.27 23.84,2.05 ccw(c22.84,2.05) 22.84,3.05 -22.86,3.05 ccw(c-22.86,2.05) -23.86,2.05 -23.86,1.27 -22.86,1.27 -22.86,-1.27 -23.86,-1.27 ; -23.86,-2.05 -23.86,-1.27 ; -23.86,-2.05 -23.86,-1.27
3D body "3M_9134-4500PL.stp": height 9, standoff -2.8, extent -23.86,-4.05 23.84,3.05